# Altium footprint library 3.12-SD、TF卡.PcbLib: 16 footprints
Each footprint in its own frame and in the unit in brackets; x right, y up, seen from the top. Pads: shape width x height; smd on the part's side, far side on the other; paste and mask are expansions set on the pad; w line width, h text height; cw(c..) or ccw(c..) is an arc to the next point about the centre after c.
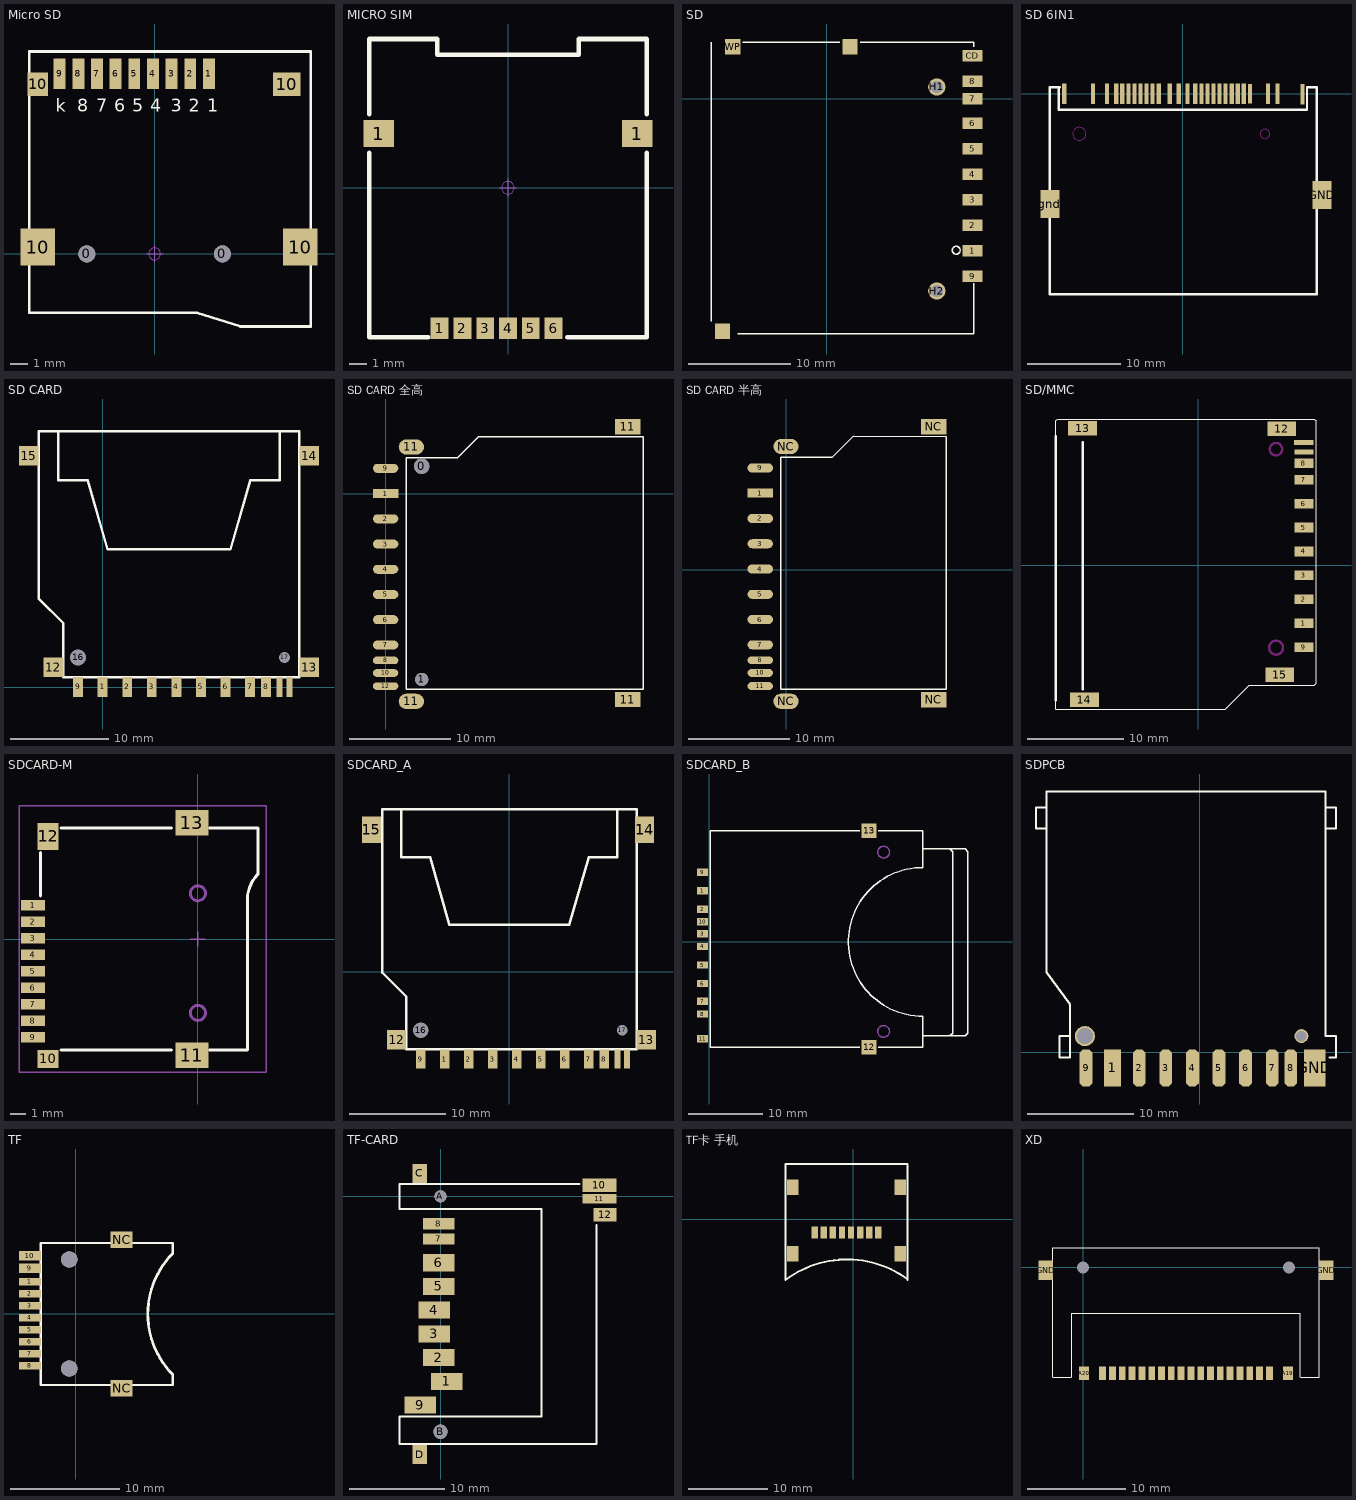
[diagram p0: the footprints below, top view; thin cyan lines are the x and y axes]

## Micro SD [mm] "淘宝ID:黄晶宝石"
pads (15):
  round 1 hole 1 unplated: 0(-4,0) 0(4,0)
  rect 0.7x1.8 smd: 1(3.2,10.627) 2(2.1,10.627) 3(1,10.627) 4(-0.1,10.627) 5(-1.2,10.627) 6(-2.3,10.627) 7(-3.4,10.627) 8(-4.5,10.627) 9(-5.6,10.627)
  rect 2.032x2.2 smd: 10(-6.9,0.4) 10(8.6,0.4)
  rect 1.2x1.4 smd: 10(-6.9,10)
  rect 1.6x1.4 smd: 10(7.8,10)
Top Overlay:
  lines w0.152: 2.489,-3.47 5.054,-4.283 9.204,-4.283 9.204,11.938 -7.402,11.938 -7.402,-3.47 2.514,-3.47
  text "1" at 3.098,8.382 h0.76
  text "2" at 2.006,8.382 h0.76
  text "3" at 0.939,8.382 h0.76
  text "4" at -0.254,8.382 h0.76
  text "5" at -1.321,8.382 h0.76
  text "6" at -2.388,8.382 h0.76
  text "7" at -3.455,8.382 h0.76
  text "8" at -4.572,8.382 h0.76
  text "k" at -5.842,8.382 h0.76
Mechanical 15:
  circle w0.05: c0,0 r0.35
  lines w0.05: -0.5,0 0.5,0 ; 0,-0.5 0,0.5
3D body "TF 卡座-A.STE": height 2, standoff -0.45, extent -7.05,-4 8.95,11.25

## MICRO SIM [mm] "16.30mm*14.66mm*1.8mm(长*宽*厚）"
pads (8):
  rect 1.7x1.5 smd: 1(-7.2,3.02) 1(7.2,3.02)
  rect 1x1.2 smd: 1(-3.81,-7.83) 2(-2.54,-7.83) 3(-1.27,-7.83) 4(0,-7.83) 5(1.27,-7.83) 6(2.54,-7.83)
Top Overlay:
  lines w0.254: -7.747,1.949 -7.747,-8.338 -4.445,-8.338 ; -7.747,4.108 -7.747,8.299 -3.937,8.299 -3.937,7.41 3.937,7.41 3.937,8.299 7.747,8.299 7.747,4.108 ; 3.302,-8.338 7.747,-8.338 7.747,1.949
Mechanical 15:
  circle w0.05: c0,0 r0.35
  lines w0.05: -0.5,0 0.5,0 ; 0,-0.5 0,0.5
3D body "MICRO SIM.STEP": height 1.85, standoff 0.04, extent -7.58,-8.13 7.58,8.13

## SD [mm] "淘宝ID:黄晶宝石"
pads (15):
  rect 2x1.1 smd: 1(14.3,-14.899) 2(14.3,-12.399) 3(14.3,-9.899) 4(14.3,-7.399) 5(14.3,-4.899) 6(14.3,-2.399) 7(14.3,0.001) 8(14.3,1.701) 9(14.3,-17.399) CD(14.3,4.201)
  rect 1.5x1.5 smd: GND1(2.3,5.101) GND2(-10.2,-22.799) WP(-9.2,5.101)
  round 1.7 hole 1.2 unplated: H1(10.8,1.151) H2(10.8,-18.849)
Top Overlay:
  circle w0.127: c12.705,-14.851 r0.39
  lines w0.127: -11.3,-21.821 -11.3,5.551 ; -8.7,-23.049 14.4,-23.049 14.4,-18.099 ; -8.2,5.551 1.3,5.551 ; 3.3,5.551 14.4,5.551 14.4,5.101

## SD 6IN1 [mm] "淘宝ID:黄晶宝石"
pads (29):
  rect 0.45x2.2 smd: 1(-9.636,-0.007) 2(-8.136,-0.007) 3(-7.136,-0.007) 4(-6.486,-0.007) 5(-5.836,-0.007) 6(-5.186,-0.007) 7(-4.536,-0.007) 8(-3.886,-0.007) 9(-3.236,-0.007) 10(-2.586,-0.007) 11(-1.396,-0.007) 12(-0.446,-0.007) 13(0.504,-0.007) 14(1.34,-0.007) 15(1.99,-0.007) 16(2.64,-0.007) 17(3.29,-0.007) 18(3.94,-0.007) 19(4.59,-0.007) 20(5.24,-0.007) 24(9.134,-0.007) 25(10.164,-0.007) 25(12.824,-0.058) 26(-12.716,-0.007)
  rect 0.44x2.2 smd: 21(5.89,-0.007) 22(6.54,-0.007)
  rect 0.45x2.1 smd: 23(7.19,-0.007)
  rect 2x3 smd: gnd(-14.246,-11.833) GND(14.929,-10.883)
Top Overlay:
  lines w0.254: -13.408,0.704 -13.306,0.704 ; -13.179,0.704 -14.271,0.704 -14.271,-21.521 14.354,-21.521 14.354,0.704 13.643,0.704 13.313,0.704 13.313,-1.709 -13.306,-1.709 ; -13.306,-1.709 -13.306,0.704 ; -13.306,-1.709 -13.306,0.704
Keep-Out Layer:
  lines w0.1: -11.796,-4.307 cw(c-11.096,-4.307) -10.396,-4.307 cw(c-11.096,-4.307) -11.796,-4.307 ; 8.304,-4.307 cw(c8.804,-4.307) 9.304,-4.307 cw(c8.804,-4.307) 8.304,-4.307

## SD CARD [mm] "淘宝ID:黄晶宝石"
pads (17):
  rect 1x2 smd: 1(0.007,0.016) 2(2.507,0.016) 3(5.007,0.016) 4(7.507,0.016) 5(10.007,0.016) 6(12.507,0.016) 7(15.007,0.016) 8(16.632,0.016) 9(-2.493,0.016)
  rect 0.6x2 smd: 10(19.007,0.016) 11(18.007,0.016)
  rect 2x2 smd: 12(-4.993,2.016) 13(21.007,2.016) 14(21.007,23.516) 15(-7.493,23.516)
  round 1.5 hole 1.6: 16(-2.493,3.016)
  round 1 hole 1.1: 17(18.507,3.016)
Top Overlay:
  lines w0.254: -4.493,26.016 -4.493,21.016 -1.493,21.016 0.507,14.016 13.007,14.016 15.007,21.016 18.007,21.016 18.007,26.016 ; -6.493,9.016 -6.493,26.016 20.007,26.016 20.007,1.016 -3.993,1.016 -3.993,6.516 -6.493,9.016

## SD CARD 全高 [mil] "淘宝ID:黄晶宝石"
pads (17):
  round 59.06 hole 59.06: 0(140,106)
  rect 98.42x35 smd: 1(0,0)
  round 51.18 hole 51.18: 1(140,-722)
  oval 98.43x35 smd: 2(0,-98) 3(0,-196) 4(0,-294) 5(0,-392) 6(0,-490) 7(0,-588) 9(0,98)
  oval 98.42x30 smd: 8(0,-648) 10(0,-697) 12(0,-748)
  oval 98.42x59.05 smd: 11(100,-807.09) 11(100,181.1)
  rect 98.42x59.05 smd: 11(940,-800) 11(940,260)
Top Overlay:
  lines w6: 220,140 80,140 ; 780,220 1000,220 1000,-760 880,-760 ; 900,-760 80,-760 80,140 ; 900,220 360,220 280,140 80,140

## SD CARD 半高 [mm] "淘宝ID:黄晶宝石"
pads (15):
  rect 2.5x0.889 smd: 1(-2.54,7.518)
  oval 2.5x0.889 smd: 2(-2.54,5.029) 3(-2.54,2.54) 4(-2.54,0.051) 5(-2.54,-2.438) 6(-2.54,-4.928) 7(-2.54,-7.417) 9(-2.54,10.008)
  oval 2.5x0.762 smd: 8(-2.54,-8.941) 10(-2.54,-10.185) 11(-2.54,-11.481)
  oval 2.5x1.5 smd: NC(0,-12.982) NC(0,12.118)
  rect 2.5x1.5 smd: NC(14.55,-12.82) NC(14.55,14.07)
Top Layer:
  lines w0.254: -0.001,12.372 0.001,11.864
Top Overlay:
  lines w0.152: 3.048,11.074 -0.508,11.074 ; -0.508,11.074 4.572,11.074 6.604,13.106 15.761,13.081 15.761,-11.811 -0.508,-11.786 -0.508,11.074

## SD/MMC [mm] "淘宝ID:黄晶宝石"
pads (15):
  rect 2x1 smd: 1(11.042,-6.055) 2(11.042,-3.555) 3(11.042,-1.055) 4(11.042,1.445) 5(11.042,3.945) 6(11.042,6.445) 7(11.042,8.945) 8(11.042,10.645) 9(11.042,-8.555)
  rect 2x0.5 smd: 10(11.042,11.839) 11(11.017,12.83)
  rect 3x1.5 smd: 12(8.727,14.275) 13(-12.073,14.3) 14(-11.873,-14.025) 15(8.527,-11.425)
Top Overlay:
  lines w0.076: -14.873,12.675 -14.873,15.075 -14.773,15.175 -14.673,15.275 12.127,15.275 12.327,15.075 12.327,-12.325 12.127,-12.525 5.327,-12.525 2.827,-15.025 -14.873,-15.025 ; -14.873,14.775 -14.873,-15.025 ; -14.873,-15.025 -14.873,-15.025
  lines w0.254: -14.873,-14.1 -14.873,13.5 ; -12.073,-12.925 -12.073,12.875
Top Paste:
  circle w0.064: c-14.659,13.624 r0.032
Keep-Out Layer:
  circle w0.254: c8.127,-8.598 r0.727
  circle w0.254: c8.127,12.125 r0.65

## SDCARD-M [mm] "TF卡       淘宝ID:黄晶宝石"
height 1.5
pads (13):
  rect 1.6x0.7 smd: 1(-11.008,2.25) 2(-11.008,1.15) 3(-11.008,0.05) 4(-11.008,-1.05) 5(-11.008,-2.15) 6(-11.008,-3.25) 7(-11.008,-4.35) 8(-11.008,-5.45) 9(-11.008,-6.55)
  rect 1.4x1.2 smd: 10(-10,-8.004)
  rect 2.2x1.7 smd: 11(-0.4,-7.75) 13(-0.4,7.75)
  rect 1.4x1.8 smd: 12(-10,6.85)
Top Overlay:
  lines w0.2: -10.5,2.88 -10.5,5.756 ; -9.144,-7.4 -1.778,-7.4 ; -9.144,7.4 -1.778,7.4 ; 0.762,-7.4 3.3,-7.4 3.3,1.016 ; 0.762,7.4 4,7.4 4,4.318 ccw(c5.69,2.628) 3.3,2.628 3.3,0.762
Mechanical 1:
  circle w0.2: c0,3.05 r0.5
  circle w0.2: c0,-4.93 r0.5
Mechanical 15:
  lines w0.1: -0.5,0 0.5,0 ; 0,-0.5 0,0.5 ; -11.938,-8.89 -11.938,8.89 4.572,8.89 4.572,-8.89 -11.938,-8.89

## SDCARD_A [mm] "SD卡不自弹       淘宝ID:黄晶宝石"
pads (17):
  rect 1x2 smd: 1(-6.731,-9.068) 2(-4.231,-9.068) 3(-1.731,-9.068) 4(0.769,-9.068) 5(3.269,-9.068) 6(5.769,-9.068) 7(8.269,-9.068) 8(9.894,-9.068) 9(-9.231,-9.068)
  rect 0.6x2 smd: 10(12.269,-9.068) 11(11.269,-9.068)
  rect 2x2 smd: 12(-11.731,-7.068) 13(14.269,-7.068)
  rect 2x2.8 smd: 14(14.097,14.808) 15(-14.351,14.808)
  round 1.5 hole 1.6: 16(-9.231,-6.068)
  round 1 hole 1.1: 17(11.769,-6.068)
Top Overlay:
  lines w0.254: -11.231,16.932 -11.231,11.932 -8.231,11.932 -6.231,4.932 6.269,4.932 8.269,11.932 11.269,11.932 11.269,16.932 ; -13.231,-0.068 -13.231,16.932 13.269,16.932 13.269,-8.068 -10.731,-8.068 -10.731,-2.568 -13.231,-0.068

## SDCARD_B [mm] "SD卡自弹       淘宝ID:黄晶宝石"
pads (13):
  rect 1.5x1 smd: 1(-0.889,6.88) 2(-0.889,4.38) 3(-0.889,1.08) 4(-0.889,-0.63) 5(-0.889,-3.13) 6(-0.889,-5.63) 7(-0.889,-8.05) 8(-0.889,-9.75) 9(-0.889,9.38) 10(-0.889,2.73) 11(-0.889,-13.1)
  rect 2x2 smd: 12(21.59,-14.224) 13(21.59,14.986)
Top Overlay:
  lines w0.2: 20.32,-14.224 0.127,-14.224 0.127,0 0.127,14.986 20.32,14.986 ; 22.86,-14.224 28.829,-14.224 28.829,-10.033 cw(c28.829,0) 28.829,10.033 28.829,14.986 22.86,14.986 ; 28.829,-12.7 32.893,-12.7 34.544,-12.7 34.925,-12.319 34.925,12.192 34.544,12.573 32.893,12.573 28.829,12.573 ; 32.512,-12.7 32.893,-12.319 32.893,12.192 32.512,12.573
Mechanical 1:
  circle w0.2: c23.55,-12.1 r0.8
  circle w0.2: c23.55,12.1 r0.8

## SDPCB [mm] "淘宝ID:黄晶宝石"
height 0.254
pads (12):
  rect 1.6x3.5 smd: 1(-8.2,-1.5)
  oct 1.2x3.5 smd: 2(-5.7,-1.5) 3(-3.2,-1.5) 4(-0.7,-1.5) 5(1.8,-1.5) 6(4.3,-1.5) 7(6.8,-1.5) 8(8.55,-1.5) 9(-10.7,-1.5)
  rect 2x3.5 smd: GND(10.8,-1.5)
  round 1.9 on Top hole 1.5: ""(-10.8,1.5)
  round 1.3 on Top hole 1: ""(9.55,1.5)
Top Overlay:
  lines w0.203: -14.4,21 -15.4,21 -15.4,23 -14.4,23 ; -12.2,1.5 -13.2,1.5 -13.2,-0.5 -12.2,-0.5 -12.2,4.5 -14.4,7.5 -14.4,24.5 11.8,24.5 11.8,1.524 ; 11.8,1.5 12.8,1.5 12.8,-0.5 12.2,-0.5 ; 11.8,21 12.8,21 12.8,23 11.8,23

## TF [mm] "淘宝ID:黄晶宝石"
pads (14):
  rect 2x0.7 smd: 1(-4.207,2.947) 2(-4.207,1.847) 3(-4.207,0.747) 4(-4.207,-0.353) 5(-4.207,-1.453) 6(-4.207,-2.553) 7(-4.207,-3.653) 8(-4.207,-4.753)
  rect 2x0.85 smd: 9(-4.207,4.197) 10(-4.207,5.347)
  rect 2x1.5 smd: NC(4.193,-6.823) NC(4.193,6.817)
  round 1.5 hole 1.5 unplated: ""(-0.607,-5.003)
  round 1.5 hole 1.5: ""(-0.607,4.997)
Top Overlay:
  lines w0.2: 8.893,-5.553 8.893,-6.518 -3.207,-6.518 -3.207,6.512 8.893,6.512 8.893,5.547
  lines w0.254: 8.893,-5.553 cw(c14.443,-0.003) 8.893,5.547

## TF-CARD [mm] "淘宝ID:黄晶宝石"
pads (16):
  rect 3.32x1.8 smd: 1(0.655,-19.487) 2(-0.175,-16.987) 3(-0.645,-14.487) 4(-0.645,-11.987) 5(-0.175,-9.487) 6(-0.175,-6.987) 9(-2.145,-21.987)
  rect 3.32x1.2 smd: 7(-0.175,-4.487) 8(-0.175,-2.862)
  rect 3.6x1.4 smd: 10(16.73,1.163)
  rect 3.6x1 smd: 11(16.73,-0.237)
  rect 2.4x1.4 smd: 12(17.32,-1.937)
  round 1.27 hole 1.27: A(-0.01,0.013)
  round 1.5 hole 1.5: B(-0.01,-24.787)
  rect 1.5x2 smd: C(-2.205,2.413) D(-2.205,-27.187)
Top Overlay:
  lines w0.204: -4.33,1.288 -4.33,-1.307 10.62,-1.307 10.62,-23.187 -4.33,-23.187 -4.33,-26.087 16.42,-26.087 16.42,-2.987 ; -4.33,1.313 14.62,1.313

## TF卡 手机 [mm] "淘宝ID:黄晶宝石"
height 12.75
pads (12):
  rect 0.8x1.5 smd: 1(3.175,-1.651) 2(2.032,-1.651) 3(0.889,-1.651) 4(-0.254,-1.651) 5(-1.397,-1.651) 6(-2.54,-1.651) 7(-3.683,-1.651) 8(-4.826,-1.651)
  rect 1.45x2 smd: ""(-7.62,-4.318) ""(-7.62,4.064) ""(5.969,-4.318) ""(5.969,4.064)
Top Overlay:
  lines w0.254: 6.782,-7.471 ccw(c-0.762,-17.907) -8.509,-7.62 -8.509,6.985 6.858,6.985 6.858,-7.62

## XD [mm] "淘宝ID:黄晶宝石"
pads (24):
  round 0 hole 1.2 unplated: 0(21,0) 1(0,0)
  rect 0.7x1.4 smd: A1(19,-10.8) A2(18,-10.8) A3(17,-10.8) A4(16,-10.8) A5(15,-10.8) A6(14,-10.8) A7(13,-10.8) A8(12,-10.8) A9(11,-10.8) A10(10,-10.8) A11(9,-10.8) A12(8,-10.8) A13(7,-10.8) A14(6,-10.8) A15(5,-10.8) A16(4,-10.8) A17(3,-10.8) A18(2,-10.8)
  rect 1x1.4 smd: A19(20.9,-10.8) A20(0.1,-10.8)
  rect 1.5x2 smd: GND(-3.8,-0.3) GND(24.8,-0.3)
Top Overlay:
  lines w0.127: -1.2,-11.19 -3.1,-11.19 -3.1,2.01 24.1,2.01 24.1,-11.19 22.2,-11.19 ; -1.16,-11.19 -1.16,-4.69 22.14,-4.69 22.14,-11.19